# Altium footprint library CADTcommon.PcbLib: 503 footprints (part 14 of 32)
Each footprint in its own frame and in the unit in brackets; x right, y up, seen from the top. Pads: shape width x height; smd on the part's side, far side on the other; paste and mask are expansions set on the pad; w line width, h text height; cw(c..) or ccw(c..) is an arc to the next point about the centre after c.
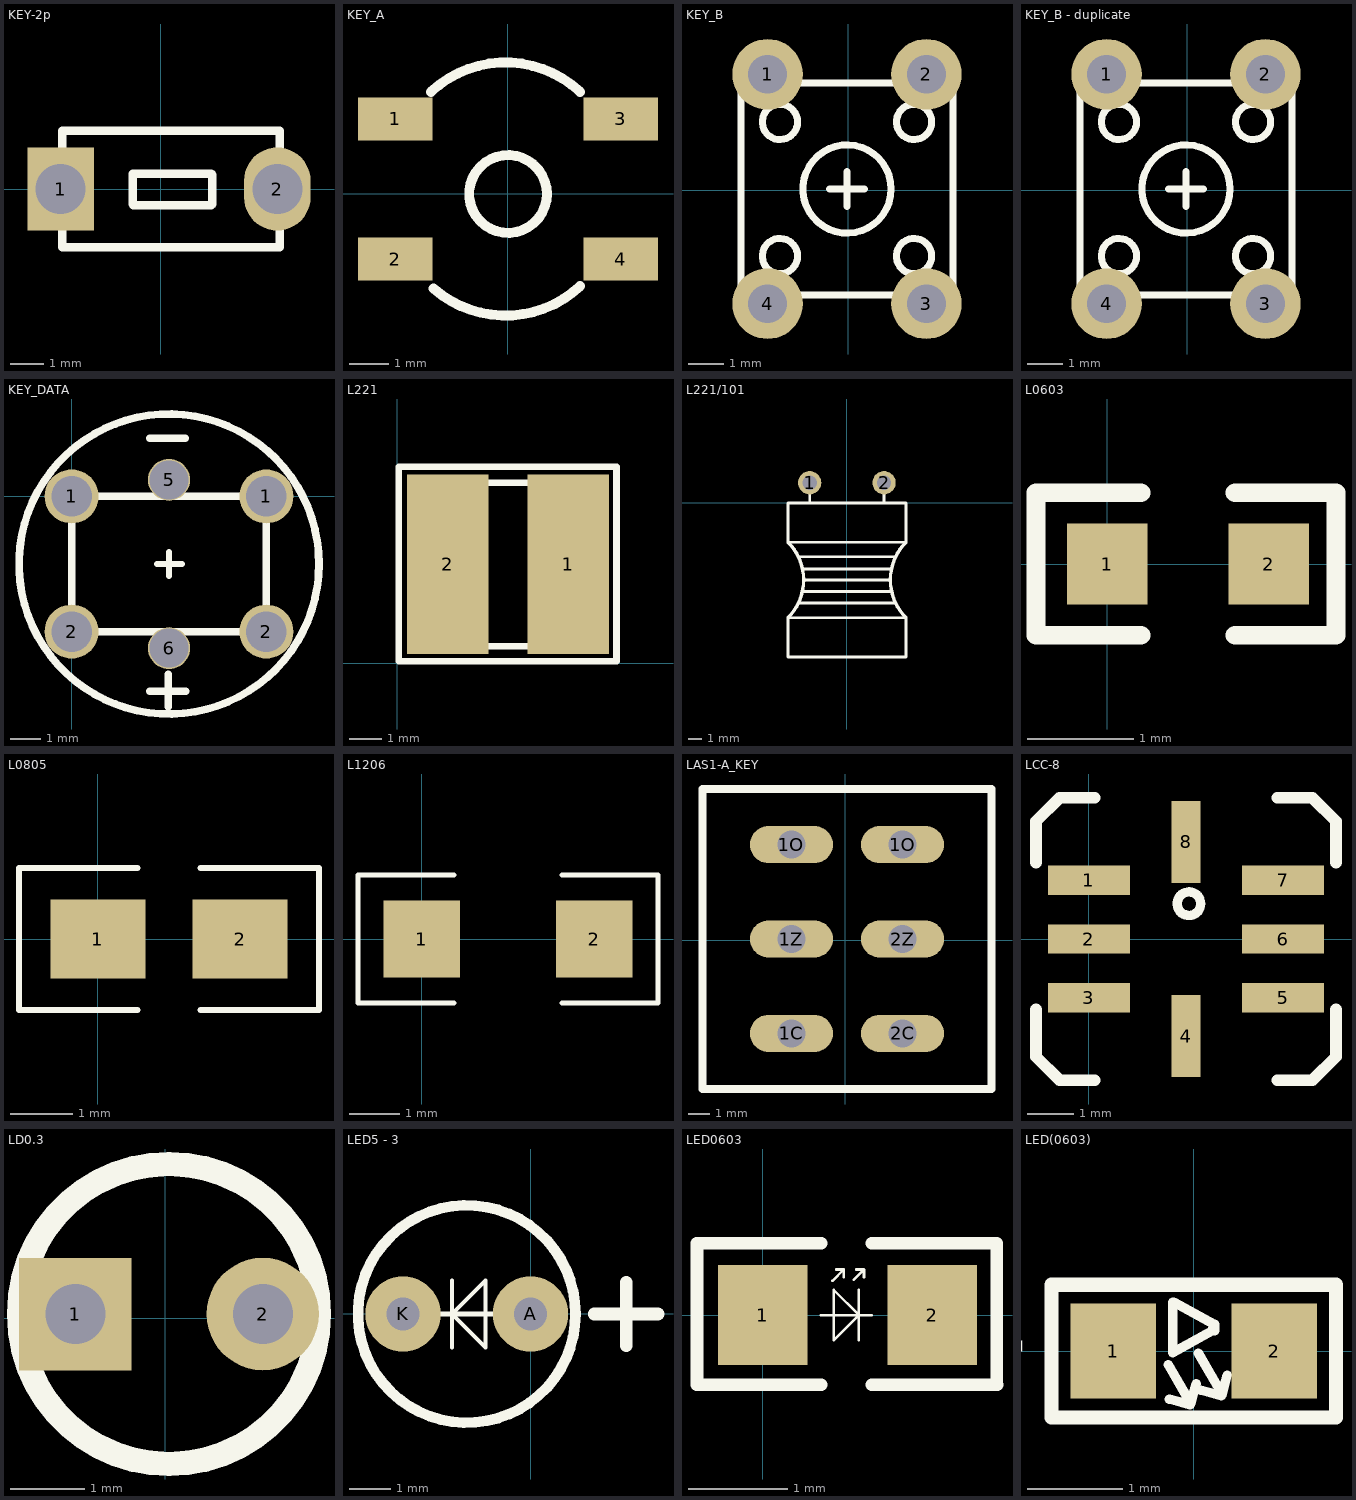
[diagram p13: the footprints below, top view; thin cyan lines are the x and y axes]

## KEY-2p [mm]
height 5
pads (2):
  rect 2x2.5 hole 1.5: 1(-2.996,0)
  oval 2x2.5 hole 1.5: 2(3.504,0)
Top Overlay:
  lines w0.254: -2.945,-1.75 3.583,-1.75 3.583,1.75 -2.945,1.75 -2.945,-1.75 ; -0.837,-0.457 -0.837,0.457 1.525,0.457 1.551,0.432 1.551,-0.457 1.525,-0.483 -0.812,-0.483 -0.837,-0.457
3D body: height 4.3, standoff -3.51, extent -3.624,-1.75 4.132,1.75

## KEY_A [mm]
pads (4):
  rect 1.9x1.1 smd: 1(-2.875,1.913) 2(-2.875,-1.659) 3(2.875,1.913) 4(2.875,-1.659)
Top Overlay:
  circle w0.254: c0,0 r0.992
  lines w0.254: -1.965,2.604 cw(c-0.064,0.572) 1.838,2.604 ; -1.901,-2.409 ccw(c-0.064,-0.318) 1.838,-2.35
3D body: height 1.5, standoff 0, extent -3.175,-2.548 3.225,2.752

## KEY_B [mm]
pads (4):
  round 2 hole 1.1: 1(-2.283,3.291) 2(2.217,3.291) 3(2.217,-3.209) 4(-2.283,-3.209)
Top Overlay:
  circle w0.2: c-0.033,0.04 r1.25
  circle w0.2: c1.867,1.94 r0.5
  circle w0.2: c-1.933,1.94 r0.5
  circle w0.2: c1.867,-1.86 r0.5
  circle w0.2: c-1.933,-1.86 r0.5
  lines w0.2: -0.533,0.04 0.467,0.04 ; -0.033,-0.46 -0.033,0.54 ; -3.033,-2.959 2.967,-2.959 2.967,3.04 -3.033,3.04 -3.033,-2.959
3D body: height 4, standoff -3.56, extent -3.127,-3.909 3.073,4.011

## KEY_B - duplicate [mm]
pads (4):
  round 2 hole 1.1: 1(-2.283,3.291) 2(2.217,3.291) 3(2.217,-3.209) 4(-2.283,-3.209)
Top Overlay:
  circle w0.2: c-1.933,-1.86 r0.5
  circle w0.2: c1.867,-1.86 r0.5
  circle w0.2: c-1.933,1.94 r0.5
  circle w0.2: c1.867,1.94 r0.5
  circle w0.2: c-0.033,0.04 r1.25
  lines w0.2: -0.533,0.04 0.467,0.04 ; -0.033,-0.46 -0.033,0.54 ; -3.033,-2.959 -3.033,3.04 2.967,3.04 2.967,-2.959 -3.033,-2.959
3D body: height 4, standoff -3.56, extent -3.127,-3.909 3.073,4.011

## KEY_DATA [mm]
pads (6):
  round 1.8 hole 1.35: 1(0,0) 1(6.49,0) 2(0,-4.508) 2(6.49,-4.508)
  round 1.4 hole 1.3: 5(3.245,0.552) 6(3.245,-5.061)
Top Overlay:
  circle w0.254: c3.245,-2.254 r5
  lines w0.2: 2.838,-2.254 3.677,-2.254 ; 3.245,-2.661 3.245,-1.848
  lines w0.254: 2.61,-6.496 3.804,-6.496 ; 2.61,1.937 3.778,1.937 ; 3.219,-7.004 3.219,-5.937 ; 0,-4.508 6.49,-4.508 6.49,0 0,0 0,-4.508

## L221 [mm]
height 1.2
pads (2):
  rect 2.5x5.5 smd: 1(5.252,3.023) 2(1.552,3.023)
Top Overlay:
  lines w0.2: 0.6,2.273 ccw(c3.402,3.023) 1.952,0.512 4.852,0.512 ccw(c3.402,3.023) 6.203,2.273 ; 0.6,3.774 cw(c3.402,3.023) 1.952,5.535 4.852,5.535 cw(c3.402,3.023) 6.203,3.774 ; 0.608,2.273 ccw(c0.608,3.023) 0.608,3.773 ; 6.196,2.273 cw(c6.196,3.023) 6.196,3.773 ; 0.049,0.052 0.049,6.021 6.729,6.021 6.729,0.052 0.049,0.052
3D body: height 4.5, standoff -0.01, extent 0.547,0.448 6.261,5.648

## L221/101 [mm]
pads (2):
  round 1.7 hole 1.05: 1(-2.718,1.473) 2(2.718,1.473)
Top Overlay:
  lines w0.2: -4.293,-8.439 -4.293,-11.252 4.318,-11.252 4.318,-8.439 ; -4.293,-8.382 4.318,-8.382 ; -4.293,-2.87 4.318,-2.87 ; -4.293,-2.813 -4.293,0 4.293,0 ; -3.556,-7.315 3.531,-7.315 ; -3.48,-3.937 3.556,-3.937 ; -3.226,-6.477 3.251,-6.477 ; -3.2,-4.826 3.175,-4.826 ; -3.023,-5.626 3.048,-5.626 ; -2.718,0 -2.718,1.473 ; 2.718,0 2.718,1.473 ; 4.318,-2.813 4.318,0
  lines w0.254: -4.293,-8.382 ccw(c-7.048,-5.626) -4.293,-2.87 ; 4.318,-8.382 cw(c7.074,-5.626) 4.318,-2.87

## L0603 [mil]
pads (2):
  rect 30x30 smd: 1(0,0) 2(60,0)
Top Overlay:
  lines w7: -26.5,26.5 -26.5,-26.5 12.5,-26.5 ; -25,26.5 12.5,26.5 ; 47.5,-26.5 85,-26.5 85,26.5 47.5,26.5
3D body: height 17.72, standoff 0, extent -1,-16 61.99,15.5

## L0805 [mil]
pads (2):
  rect 60x50 smd: 1(0,0) 2(90,0)
Top Overlay:
  lines w3.94: 25,-45 -50,-45 -50,45 25,45 ; 65,-45 140,-45 140,45 65,45
3D body: height 37.4, standoff 0, extent 5.63,-23.24 84.37,24

## L1206 [mil]
pads (2):
  rect 60x60 smd: 1(0,0) 2(135,0)
Top Overlay:
  lines w3.94: 25,-50 -50,-50 -50,50 25,50 ; 110,-50 185,-50 185,50 110,50
3D body: height 43.31, standoff 0, extent 5.01,-32 130.99,30.99

## LAS1-A_KEY [mm] "5A/220V-AC"
pads (6):
  oval 3.8x1.7 hole 1.27: 1C(-2.464,-4.267) 1O(-2.464,4.369) 1O(2.616,4.369) 1Z(-2.464,0.051) 2C(2.616,-4.267) 2Z(2.616,0.051)
Top Overlay:
  lines w0.381: -6.528,-6.807 -6.528,6.909 6.68,6.909 6.68,-6.807 -6.528,-6.807
Mechanical 1:
  lines w1.27: -3.522,-4.247 -1.502,-4.257 ; -3.522,0.071 -1.502,0.061 ; -3.522,4.389 -1.502,4.379 ; 1.558,-4.247 3.578,-4.257 ; 1.558,0.071 3.578,0.061 ; 1.558,4.389 3.578,4.379

## LCC-8 [mil]
pads (8):
  rect 70x25 smd: 1(0,50) 2(0,0) 3(0,-50) 5(165,-50) 6(165,0) 7(165,50)
  rect 25x70 smd: 4(82.5,-82.5) 8(82.5,82.5)
Top Overlay:
  circle w8: c85,30 r10
  lines w10: -45,-60 -45,-100 -25,-120 5,-120 ; -45,65 -45,100 -25,120 5,120 ; 160,-120 190,-120 210,-100 210,-60 ; 160,120 190,120 210,100 210,65

## LD0.3 [mil] "LED"
pads (2):
  rect 60x60 hole 32: 1(-48.04,2.37)
  round 60 hole 32: 2(51.96,2.37)
Top Overlay:
  circle w13: c1.96,2.37 r80

## LED5 - 3 [mm]
pads (2):
  round 1.8 hole 0.8: A(0,0) K(-3.048,0)
Top Overlay:
  circle w0.254: c-1.524,0 r2.6
  lines w0.1: -1.878,-0.8 -1.878,0 ; -1.878,0.8 -1.878,0 ; -1.878,0 -1.078,0.8 -1.078,-0.8 -1.878,0
  lines w0.127: -2.134,0 -0.889,0
  lines w0.305: 1.524,0 3.048,0 ; 2.286,-0.762 2.286,0.762
3D body: height 8.6, standoff -2, extent -4.196,-2.977 1.154,2.723

## LED0603 [mm]
pads (2):
  rect 0.9x1 smd: 1(0,0) 2(1.7,0)
Top Overlay:
  lines w0.025: 0.584,0 1.092,0 ; 0.699,0.343 0.813,0.457 ; 0.737,0.457 0.813,0.457 ; 0.813,0.381 0.813,0.457 ; 0.914,0.356 1.016,0.457 ; 0.94,0.457 1.016,0.457 ; 0.965,-0.254 0.965,0.254 ; 1.016,0.381 1.016,0.457 ; 0.711,-0.254 0.711,0.254 0.965,0 0.711,-0.254
  lines w0.127: 0.584,-0.701 -0.66,-0.701 -0.66,0.722 0.584,0.722 ; 1.092,-0.701 2.351,-0.701 ; 1.092,0.722 2.35,0.722 2.35,-0.7
3D body: height 1.1, standoff -0.01, extent -0.152,-0.66 1.88,0.61

## LED(0603) [mm]
pads (2):
  rect 0.9x1 smd: 1(-0.85,0) 2(0.85,0)
Top Overlay:
  lines w0.1: -0.267,-0.145 -0.031,-0.553 0.025,-0.344 ; -0.256,-0.506 -0.039,-0.565 ; -0.223,0.513 -0.223,-0.016 0.195,0.216 0.214,0.282 -0.209,0.514 ; 0.048,-0.02 0.299,-0.454 ; 0.072,-0.411 0.29,-0.47 ; 0.223,0.216 0.223,0.282 ; 0.295,-0.467 0.352,-0.256
  lines w0.15: -1.5,-0.7 -1.5,0.7 1.5,0.7 1.5,-0.7 -1.5,-0.7
  text "+" at -1.663,0.483 h1
3D body: height 1.1, standoff -0.01, extent -1.028,-0.635 1.004,0.635